# Altium schematic symbol library Capacitor - Aluminium TH.SchLib: 4591 symbols (part 10 of 27)
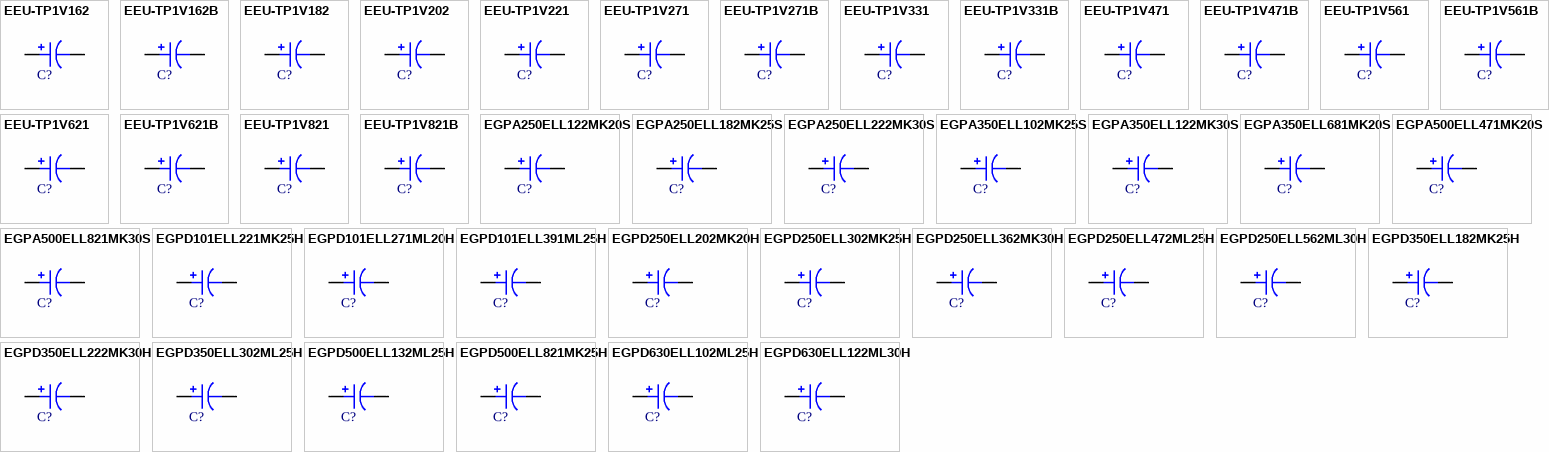
[diagram p123: symbols EEU-TP1V162 to EGPD630ELL122ML30H]

## EGPA350ELL122MK30S
designator C?, comment 1200uF  (value not drawn)
CAP ALUM 1200UF 20% 35V RADIAL; Part Number: EGPA350ELL122MK30S; Manufacturer: United Chemi-Con; TemperatureRange: -40C ~ 125C; Type: Polar; Ripple Current: 1.536A @ 120Hz; Value: 1200uF; PartId: 24370; Supplier 1: Digi-Key; Supplier Part Number 1: 565-3387-ND; ComponentLink1Description: Datasheet; ComponentLink1URL: //media.digikey.com/pdf/Data%20Sheets/United%20Chemi-Con%20PDFs/GPA_Series.PDF; ComponentLink2Description: Digi-Key Listing; ComponentLink2URL: https://www.digikey.com/product-detail/en/united-chemi-con/EGPA350ELL122MK30S/565-3387-ND/3528526; Tolerance: 20%; Voltage: 35V; Price: 1.59; Device Package: Radial, Can, 12.5mm
footprint CAP AL TH D12.5 L5 H35.5
pins: 1, 2

## EGPA350ELL681MK20S
designator C?, comment 680uF  (value not drawn)
CAP ALUM 680UF 20% 35V RADIAL; Part Number: EGPA350ELL681MK20S; Manufacturer: United Chemi-Con; TemperatureRange: -40C ~ 125C; Type: Polar; Ripple Current: 1.092A @ 120Hz; Value: 680uF; PartId: 23040; Supplier 1: Digi-Key; Supplier Part Number 1: 565-3388-ND; ComponentLink1Description: Datasheet; ComponentLink1URL: //media.digikey.com/pdf/Data%20Sheets/United%20Chemi-Con%20PDFs/GPA_Series.PDF; ComponentLink2Description: Digi-Key Listing; ComponentLink2URL: https://www.digikey.com/product-detail/en/united-chemi-con/EGPA350ELL681MK20S/565-3388-ND/3528541; Tolerance: 20%; Voltage: 35V; Price: 0; Device Package: Radial, Can, 12.5mm
footprint CAP AL TH D12.5 L5 H21.5
pins: 1, 2

## EGPA500ELL471MK20S
designator C?, comment 470uF  (value not drawn)
CAP ALUM 470UF 20% 50V RADIAL; Part Number: EGPA500ELL471MK20S; Manufacturer: United Chemi-Con; TemperatureRange: -40C ~ 125C; Type: Polar; Ripple Current: 750mA @ 120Hz; Value: 470uF; PartId: 23041; Supplier 1: Digi-Key; Supplier Part Number 1: 565-3397-ND; ComponentLink1Description: Datasheet; ComponentLink1URL: //media.digikey.com/pdf/Data%20Sheets/United%20Chemi-Con%20PDFs/GPA_Series.PDF; ComponentLink2Description: Digi-Key Listing; ComponentLink2URL: https://www.digikey.com/product-detail/en/united-chemi-con/EGPA500ELL471MK20S/565-3397-ND/3528552; Tolerance: 20%; Voltage: 50V; Price: 0; Device Package: Radial, Can, 12.5mm
footprint CAP AL TH D12.5 L5 H21.5
pins: 1, 2

## EGPA500ELL821MK30S
designator C?, comment 820uF  (value not drawn)
CAP ALUM 820UF 20% 50V RADIAL; Part Number: EGPA500ELL821MK30S; Manufacturer: United Chemi-Con; TemperatureRange: -40C ~ 125C; Type: Polar; Ripple Current: 1.29A @ 120Hz; Value: 820uF; PartId: 24342; Supplier 1: Digi-Key; Supplier Part Number 1: 565-3398-ND; ComponentLink1Description: Datasheet; ComponentLink1URL: //media.digikey.com/pdf/Data%20Sheets/United%20Chemi-Con%20PDFs/GPA_Series.PDF; ComponentLink2Description: Digi-Key Listing; ComponentLink2URL: https://www.digikey.com/product-detail/en/united-chemi-con/EGPA500ELL821MK30S/565-3398-ND/3528555; Tolerance: 20%; Voltage: 50V; Price: 1.33; Device Package: Radial, Can, 12.5mm
footprint CAP AL TH D12.5 L5 H35.5
pins: 1, 2

## EGPD101ELL221MK25H
designator C?, comment 220uF  (value not drawn)
CAP ALUM 220UF 20% 100V RADIAL; Part Number: EGPD101ELL221MK25H; Manufacturer: United Chemi-Con; TemperatureRange: -40C ~ 135C; Type: Polar; Ripple Current: 1.07A @ 120Hz; Value: 220uF; PartId: 23773; Supplier 1: Digi-Key; Supplier Part Number 1: 565-3824-ND; ComponentLink1Description: Datasheet; ComponentLink1URL: http://www.chemi-con.co.jp/cgi-bin/CAT_DB/SEARCH/cat_db_al.cgi?e=e&j=p&pdfname=gpd; ComponentLink2Description: Digi-Key Listing; ComponentLink2URL: https://www.digikey.com/product-detail/en/united-chemi-con/EGPD101ELL221MK25H/565-3824-ND/4843634; Tolerance: 20%; Voltage: 100V; Price: 2.01; Device Package: Radial, Can, 12.5mm
footprint CAP AL TH D12.5 L5 H26.5
pins: 1, 2

## EGPD101ELL271ML20H
designator C?, comment 270uF  (value not drawn)
CAP ALUM 270UF 20% 100V RADIAL; Part Number: EGPD101ELL271ML20H; Manufacturer: United Chemi-Con; TemperatureRange: -40C ~ 135C; Type: Polar; Ripple Current: 1.025A @ 120Hz; Value: 270uF; PartId: 26502; Supplier 1: Digi-Key; Supplier Part Number 1: 565-3825-ND; ComponentLink1Description: Datasheet; ComponentLink1URL: http://www.chemi-con.co.jp/cgi-bin/CAT_DB/SEARCH/cat_db_al.cgi?e=e&j=p&pdfname=gpd; ComponentLink2Description: Digi-Key Listing; ComponentLink2URL: https://www.digikey.com/product-detail/en/united-chemi-con/EGPD101ELL271ML20H/565-3825-ND/4843635; Tolerance: 20%; Voltage: 100V; Price: 2.47; Device Package: Radial, Can, 16mm
footprint CAP AL TH D16 L7.5 H22
pins: 1, 2

## EGPD101ELL391ML25H
designator C?, comment 390uF  (value not drawn)
CAP ALUM 390UF 20% 100V RADIAL; Part Number: EGPD101ELL391ML25H; Manufacturer: United Chemi-Con; TemperatureRange: -40C ~ 135C; Type: Polar; Ripple Current: 1.395A @ 120Hz; Value: 390uF; PartId: 26730; Supplier 1: Digi-Key; Supplier Part Number 1: 565-3827-ND; ComponentLink1Description: Datasheet; ComponentLink1URL: http://www.chemi-con.co.jp/cgi-bin/CAT_DB/SEARCH/cat_db_al.cgi?e=e&j=p&pdfname=gpd; ComponentLink2Description: Digi-Key Listing; ComponentLink2URL: https://www.digikey.com/product-detail/en/united-chemi-con/EGPD101ELL391ML25H/565-3827-ND/4843637; Tolerance: 20%; Voltage: 100V; Price: 3.13; Device Package: Radial, Can, 16mm
footprint CAP AL TH D16 L7.5 H26.5
pins: 1, 2

## EGPD250ELL202MK20H
designator C?, comment 2000uF  (value not drawn)
CAP ALUM 2000UF 20% 25V RADIAL; Part Number: EGPD250ELL202MK20H; Manufacturer: United Chemi-Con; TemperatureRange: -40C ~ 135C; Type: Polar; Ripple Current: 1.656A @ 120Hz; Value: 2000uF; PartId: 23070; Supplier 1: Digi-Key; Supplier Part Number 1: 565-3794-ND; ComponentLink1Description: Datasheet; ComponentLink1URL: http://www.chemi-con.co.jp/cgi-bin/CAT_DB/SEARCH/cat_db_al.cgi?e=e&j=p&pdfname=gpd; ComponentLink2Description: Digi-Key Listing; ComponentLink2URL: https://www.digikey.com/product-detail/en/united-chemi-con/EGPD250ELL202MK20H/565-3794-ND/4843604; Tolerance: 20%; Voltage: 25V; Price: 0; Device Package: Radial, Can, 12.5mm
footprint CAP AL TH D12.5 L5 H21.5
pins: 1, 2

## EGPD250ELL302MK25H
designator C?, comment 3000uF  (value not drawn)
CAP ALUM 3000UF 20% 25V RADIAL; Part Number: EGPD250ELL302MK25H; Manufacturer: United Chemi-Con; TemperatureRange: -40C ~ 135C; Type: Polar; Ripple Current: 2.61A @ 120Hz; Value: 3000uF; PartId: 24181; Supplier 1: Digi-Key; Supplier Part Number 1: 565-3795-ND; ComponentLink1Description: Datasheet; ComponentLink1URL: http://www.chemi-con.co.jp/cgi-bin/CAT_DB/SEARCH/cat_db_al.cgi?e=e&j=p&pdfname=gpd; ComponentLink2Description: Digi-Key Listing; ComponentLink2URL: https://www.digikey.com/product-detail/en/united-chemi-con/EGPD250ELL302MK25H/565-3795-ND/4843605; Tolerance: 20%; Voltage: 25V; Price: 1.92; Device Package: Radial, Can, 12.5mm
footprint CAP AL TH D12.5 L5 H27
pins: 1, 2

## EGPD250ELL362MK30H
designator C?, comment 3600uF  (value not drawn)
CAP ALUM 3600UF 20% 25V RADIAL; Part Number: EGPD250ELL362MK30H; Manufacturer: United Chemi-Con; TemperatureRange: -40C ~ 135C; Type: Polar; Ripple Current: 3.3675A @ 120Hz; Value: 3600uF; PartId: 24415; Supplier 1: Digi-Key; Supplier Part Number 1: 565-3796-ND; ComponentLink1Description: Datasheet; ComponentLink1URL: http://www.chemi-con.co.jp/cgi-bin/CAT_DB/SEARCH/cat_db_al.cgi?e=e&j=p&pdfname=gpd; ComponentLink2Description: Digi-Key Listing; ComponentLink2URL: https://www.digikey.com/product-detail/en/united-chemi-con/EGPD250ELL362MK30H/565-3796-ND/4843606; Tolerance: 20%; Voltage: 25V; Price: 2.14; Device Package: Radial, Can, 12.5mm
footprint CAP AL TH D12.5 L5 H35.5
pins: 1, 2

## EGPD250ELL472ML25H
designator C?, comment 4700uF  (value not drawn)
CAP ALUM 4700UF 20% 25V RADIAL; Part Number: EGPD250ELL472ML25H; Manufacturer: United Chemi-Con; TemperatureRange: -40C ~ 135C; Type: Polar; Ripple Current: 3.621A @ 120Hz; Value: 4700uF; PartId: 26722; Supplier 1: Digi-Key; Supplier Part Number 1: 565-3797-ND; ComponentLink1Description: Datasheet; ComponentLink1URL: http://www.chemi-con.co.jp/cgi-bin/CAT_DB/SEARCH/cat_db_al.cgi?e=e&j=p&pdfname=gpd; ComponentLink2Description: Digi-Key Listing; ComponentLink2URL: https://www.digikey.com/product-detail/en/united-chemi-con/EGPD250ELL472ML25H/565-3797-ND/4843607; Tolerance: 20%; Voltage: 25V; Price: 2.79; Device Package: Radial, Can, 16mm
footprint CAP AL TH D16 L7.5 H26.5
pins: 1, 2

## EGPD250ELL562ML30H
designator C?, comment 5600uF  (value not drawn)
CAP ALUM 5600UF 20% 25V RADIAL; Part Number: EGPD250ELL562ML30H; Manufacturer: United Chemi-Con; TemperatureRange: -40C ~ 135C; Type: Polar; Ripple Current: 2.89A @ 120Hz; Value: 5600uF; PartId: 27278; Supplier 1: Digi-Key; Supplier Part Number 1: 565-3798-ND; ComponentLink1Description: Datasheet; ComponentLink1URL: http://www.chemi-con.co.jp/cgi-bin/CAT_DB/SEARCH/cat_db_al.cgi?e=e&j=p&pdfname=gpd; ComponentLink2Description: Digi-Key Listing; ComponentLink2URL: https://www.digikey.com/product-detail/en/united-chemi-con/EGPD250ELL562ML30H/565-3798-ND/4843608; Tolerance: 20%; Voltage: 25V; Price: 3.15; Device Package: Radial, Can, 16mm
footprint CAP AL TH D16 L7.5 H33.5
pins: 1, 2

## EGPD350ELL182MK25H
designator C?, comment 1800uF  (value not drawn)
CAP ALUM 1800UF 20% 35V RADIAL; Part Number: EGPD350ELL182MK25H; Manufacturer: United Chemi-Con; TemperatureRange: -40C ~ 135C; Type: Polar; Ripple Current: 2.088A @ 120Hz; Value: 1800uF; PartId: 23772; Supplier 1: Digi-Key; Supplier Part Number 1: 565-3801-ND; ComponentLink1Description: Datasheet; ComponentLink1URL: http://www.chemi-con.co.jp/cgi-bin/CAT_DB/SEARCH/cat_db_al.cgi?e=e&j=p&pdfname=gpd; ComponentLink2Description: Digi-Key Listing; ComponentLink2URL: https://www.digikey.com/product-detail/en/united-chemi-con/EGPD350ELL182MK25H/565-3801-ND/4843611; Tolerance: 20%; Voltage: 35V; Price: 1.94; Device Package: Radial, Can, 12.5mm
footprint CAP AL TH D12.5 L5 H26.5
pins: 1, 2

## EGPD350ELL222MK30H
designator C?, comment 2200uF  (value not drawn)
CAP ALUM 2200UF 20% 35V RADIAL; Part Number: EGPD350ELL222MK30H; Manufacturer: United Chemi-Con; TemperatureRange: -40C ~ 135C; Type: Polar; Ripple Current: 3.3675A @ 120Hz; Value: 2200uF; PartId: 24417; Supplier 1: Digi-Key; Supplier Part Number 1: 565-3802-ND; ComponentLink1Description: Datasheet; ComponentLink1URL: http://www.chemi-con.co.jp/cgi-bin/CAT_DB/SEARCH/cat_db_al.cgi?e=e&j=p&pdfname=gpd; ComponentLink2Description: Digi-Key Listing; ComponentLink2URL: https://www.digikey.com/product-detail/en/united-chemi-con/EGPD350ELL222MK30H/565-3802-ND/4843612; Tolerance: 20%; Voltage: 35V; Price: 2.19; Device Package: Radial, Can, 12.5mm
footprint CAP AL TH D12.5 L5 H35.5
pins: 1, 2

## EGPD350ELL302ML25H
designator C?, comment 3000uF  (value not drawn)
CAP ALUM 3000UF 20% 35V RADIAL; Part Number: EGPD350ELL302ML25H; Manufacturer: United Chemi-Con; TemperatureRange: -40C ~ 135C; Type: Polar; Ripple Current: 3.195A @ 120Hz; Value: 3000uF; PartId: 26727; Supplier 1: Digi-Key; Supplier Part Number 1: 565-3804-ND; ComponentLink1Description: Datasheet; ComponentLink1URL: http://www.chemi-con.co.jp/cgi-bin/CAT_DB/SEARCH/cat_db_al.cgi?e=e&j=p&pdfname=gpd; ComponentLink2Description: Digi-Key Listing; ComponentLink2URL: https://www.digikey.com/product-detail/en/united-chemi-con/EGPD350ELL302ML25H/565-3804-ND/4843614; Tolerance: 20%; Voltage: 35V; Price: 2.92; Device Package: Radial, Can, 16mm
footprint CAP AL TH D16 L7.5 H26.5
pins: 1, 2

## EGPD500ELL132ML25H
designator C?, comment 1300uF  (value not drawn)
CAP ALUM 1300UF 20% 50V RADIAL; Part Number: EGPD500ELL132ML25H; Manufacturer: United Chemi-Con; TemperatureRange: -40C ~ 135C; Type: Polar; Ripple Current: 2.424A @ 120Hz; Value: 1300uF; PartId: 26716; Supplier 1: Digi-Key; Supplier Part Number 1: 565-3808-ND; ComponentLink1Description: Datasheet; ComponentLink1URL: http://www.chemi-con.co.jp/cgi-bin/CAT_DB/SEARCH/cat_db_al.cgi?e=e&j=p&pdfname=gpd; ComponentLink2Description: Digi-Key Listing; ComponentLink2URL: https://www.digikey.com/product-detail/en/united-chemi-con/EGPD500ELL132ML25H/565-3808-ND/4843618; Tolerance: 20%; Voltage: 50V; Price: 2.56; Device Package: Radial, Can, 16mm
footprint CAP AL TH D16 L7.5 H26.5
pins: 1, 2

## EGPD500ELL821MK25H
designator C?, comment 820uF  (value not drawn)
CAP ALUM 820UF 20% 50V RADIAL; Part Number: EGPD500ELL821MK25H; Manufacturer: United Chemi-Con; TemperatureRange: -40C ~ 135C; Type: Polar; Ripple Current: 2.01A @ 120Hz; Value: 820uF; PartId: 23764; Supplier 1: Digi-Key; Supplier Part Number 1: 565-3807-ND; ComponentLink1Description: Datasheet; ComponentLink1URL: http://www.chemi-con.co.jp/cgi-bin/CAT_DB/SEARCH/cat_db_al.cgi?e=e&j=p&pdfname=gpd; ComponentLink2Description: Digi-Key Listing; ComponentLink2URL: https://www.digikey.com/product-detail/en/united-chemi-con/EGPD500ELL821MK25H/565-3807-ND/4843617; Tolerance: 20%; Voltage: 50V; Price: 1.79; Device Package: Radial, Can, 12.5mm
footprint CAP AL TH D12.5 L5 H26.5
pins: 1, 2

## EGPD630ELL102ML25H
designator C?, comment 1000uF  (value not drawn)
CAP ALUM 1000UF 20% 63V RADIAL; Part Number: EGPD630ELL102ML25H; Manufacturer: United Chemi-Con; TemperatureRange: -40C ~ 135C; Type: Polar; Ripple Current: 1.764A @ 120Hz; Value: 1000uF; PartId: 26718; Supplier 1: Digi-Key; Supplier Part Number 1: 565-3814-ND; ComponentLink1Description: Datasheet; ComponentLink1URL: http://www.chemi-con.co.jp/cgi-bin/CAT_DB/SEARCH/cat_db_al.cgi?e=e&j=p&pdfname=gpd; ComponentLink2Description: Digi-Key Listing; ComponentLink2URL: https://www.digikey.com/product-detail/en/united-chemi-con/EGPD630ELL102ML25H/565-3814-ND/4843624; Tolerance: 20%; Voltage: 63V; Price: 2.61; Device Package: Radial, Can, 16mm
footprint CAP AL TH D16 L7.5 H26.5
pins: 1, 2

## EGPD630ELL122ML30H
designator C?, comment 1200uF  (value not drawn)
CAP ALUM 1200UF 20% 63V RADIAL; Part Number: EGPD630ELL122ML30H; Manufacturer: United Chemi-Con; TemperatureRange: -40C ~ 135C; Type: Polar; Ripple Current: 2.316A @ 120Hz; Value: 1200uF; PartId: 27264; Supplier 1: Digi-Key; Supplier Part Number 1: 565-3815-ND; ComponentLink1Description: Datasheet; ComponentLink1URL: http://www.chemi-con.co.jp/cgi-bin/CAT_DB/SEARCH/cat_db_al.cgi?e=e&j=p&pdfname=gpd; ComponentLink2Description: Digi-Key Listing; ComponentLink2URL: https://www.digikey.com/product-detail/en/united-chemi-con/EGPD630ELL122ML30H/565-3815-ND/4843625; Tolerance: 20%; Voltage: 63V; Price: 2.9; Device Package: Radial, Can, 16mm
footprint CAP AL TH D16 L7.5 H33.5
pins: 1, 2

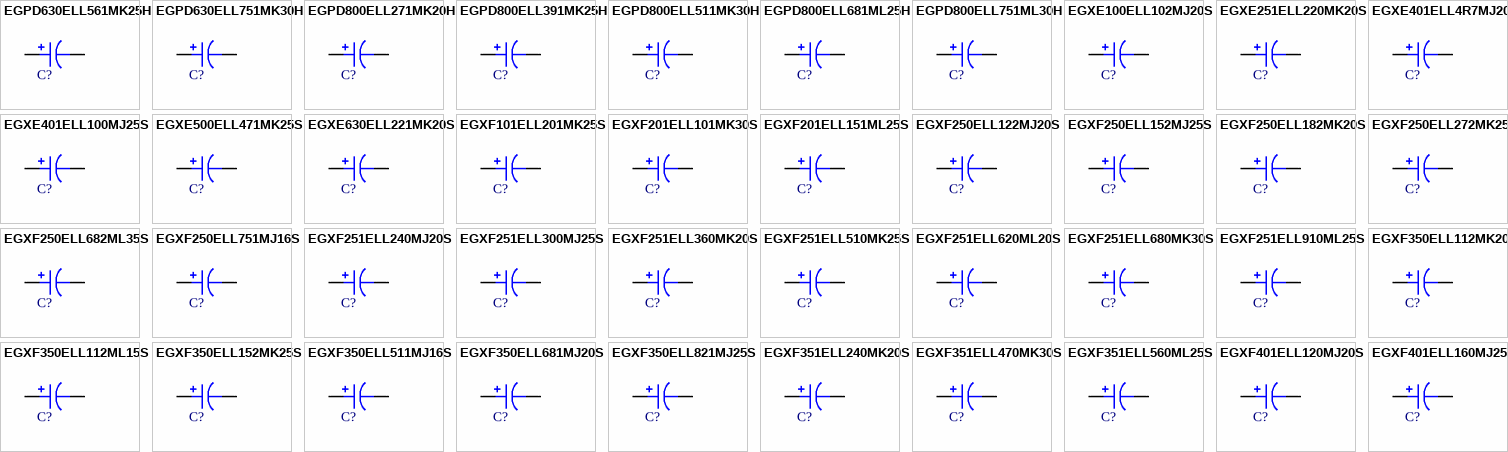
[diagram p39: symbols EGPD630ELL561MK25H to EGXF401ELL160MJ25S]

## EGPD630ELL561MK25H
designator C?, comment 560uF  (value not drawn)
CAP ALUM 560UF 20% 63V RADIAL; Part Number: EGPD630ELL561MK25H; Manufacturer: United Chemi-Con; TemperatureRange: -40C ~ 135C; Type: Polar; Ripple Current: 1.26A @ 120Hz; Value: 560uF; PartId: 23769; Supplier 1: Digi-Key; Supplier Part Number 1: 565-3811-ND; ComponentLink1Description: Datasheet; ComponentLink1URL: http://www.chemi-con.co.jp/cgi-bin/CAT_DB/SEARCH/cat_db_al.cgi?e=e&j=p&pdfname=gpd; ComponentLink2Description: Digi-Key Listing; ComponentLink2URL: https://www.digikey.com/product-detail/en/united-chemi-con/EGPD630ELL561MK25H/565-3811-ND/4843621; Tolerance: 20%; Voltage: 63V; Price: 1.88; Device Package: Radial, Can, 12.5mm
footprint CAP AL TH D12.5 L5 H26.5
pins: 1, 2

## EGPD630ELL751MK30H
designator C?, comment 750uF  (value not drawn)
CAP ALUM 750UF 20% 63V RADIAL; Part Number: EGPD630ELL751MK30H; Manufacturer: United Chemi-Con; TemperatureRange: -40C ~ 135C; Type: Polar; Ripple Current: 2.3325A @ 120Hz; Value: 750uF; PartId: 24407; Supplier 1: Digi-Key; Supplier Part Number 1: 565-3812-ND; ComponentLink1Description: Datasheet; ComponentLink1URL: http://www.chemi-con.co.jp/cgi-bin/CAT_DB/SEARCH/cat_db_al.cgi?e=e&j=p&pdfname=gpd; ComponentLink2Description: Digi-Key Listing; ComponentLink2URL: https://www.digikey.com/product-detail/en/united-chemi-con/EGPD630ELL751MK30H/565-3812-ND/4843622; Tolerance: 20%; Voltage: 63V; Price: 1.99; Device Package: Radial, Can, 12.5mm
footprint CAP AL TH D12.5 L5 H35.5
pins: 1, 2

## EGPD800ELL271MK20H
designator C?, comment 270uF  (value not drawn)
CAP ALUM 270UF 20% 80V RADIAL; Part Number: EGPD800ELL271MK20H; Manufacturer: United Chemi-Con; TemperatureRange: -40C ~ 135C; Type: Polar; Ripple Current: 820mA @ 120Hz; Value: 270uF; PartId: 23073; Supplier 1: Digi-Key; Supplier Part Number 1: 565-3817-ND; ComponentLink1Description: Datasheet; ComponentLink1URL: http://www.chemi-con.co.jp/cgi-bin/CAT_DB/SEARCH/cat_db_al.cgi?e=e&j=p&pdfname=gpd; ComponentLink2Description: Digi-Key Listing; ComponentLink2URL: https://www.digikey.com/product-detail/en/united-chemi-con/EGPD800ELL271MK20H/565-3817-ND/4843627; Tolerance: 20%; Voltage: 80V; Price: 0; Device Package: Radial, Can, 12.5mm
footprint CAP AL TH D12.5 L5 H21.5
pins: 1, 2

## EGPD800ELL391MK25H
designator C?, comment 390uF  (value not drawn)
CAP ALUM 390UF 20% 80V RADIAL; Part Number: EGPD800ELL391MK25H; Manufacturer: United Chemi-Con; TemperatureRange: -40C ~ 135C; Type: Polar; Ripple Current: 1.26A @ 120Hz; Value: 390uF; PartId: 23743; Supplier 1: Digi-Key; Supplier Part Number 1: 565-3818-ND; ComponentLink1Description: Datasheet; ComponentLink1URL: http://www.chemi-con.co.jp/cgi-bin/CAT_DB/SEARCH/cat_db_al.cgi?e=e&j=p&pdfname=gpd; ComponentLink2Description: Digi-Key Listing; ComponentLink2URL: https://www.digikey.com/product-detail/en/united-chemi-con/EGPD800ELL391MK25H/565-3818-ND/4843628; Tolerance: 20%; Voltage: 80V; Price: 1.62; Device Package: Radial, Can, 12.5mm
footprint CAP AL TH D12.5 L5 H26.5
pins: 1, 2

## EGPD800ELL511MK30H
designator C?, comment 510uF  (value not drawn)
CAP ALUM 510UF 20% 80V RADIAL; Part Number: EGPD800ELL511MK30H; Manufacturer: United Chemi-Con; TemperatureRange: -40C ~ 135C; Type: Polar; Ripple Current: 1.555A @ 120Hz; Value: 510uF; PartId: 24414; Supplier 1: Digi-Key; Supplier Part Number 1: 565-3819-ND; ComponentLink1Description: Datasheet; ComponentLink1URL: http://www.chemi-con.co.jp/cgi-bin/CAT_DB/SEARCH/cat_db_al.cgi?e=e&j=p&pdfname=gpd; ComponentLink2Description: Digi-Key Listing; ComponentLink2URL: https://www.digikey.com/product-detail/en/united-chemi-con/EGPD800ELL511MK30H/565-3819-ND/4843629; Tolerance: 20%; Voltage: 80V; Price: 2.1; Device Package: Radial, Can, 12.5mm
footprint CAP AL TH D12.5 L5 H35.5
pins: 1, 2

## EGPD800ELL681ML25H
designator C?, comment 680uF  (value not drawn)
CAP ALUM 680UF 20% 80V RADIAL; Part Number: EGPD800ELL681ML25H; Manufacturer: United Chemi-Con; TemperatureRange: -40C ~ 135C; Type: Polar; Ripple Current: 1.764A @ 120Hz; Value: 680uF; PartId: 26721; Supplier 1: Digi-Key; Supplier Part Number 1: 565-3820-ND; ComponentLink1Description: Datasheet; ComponentLink1URL: http://www.chemi-con.co.jp/cgi-bin/CAT_DB/SEARCH/cat_db_al.cgi?e=e&j=p&pdfname=gpd; ComponentLink2Description: Digi-Key Listing; ComponentLink2URL: https://www.digikey.com/product-detail/en/united-chemi-con/EGPD800ELL681ML25H/565-3820-ND/4843630; Tolerance: 20%; Voltage: 80V; Price: 2.76; Device Package: Radial, Can, 16mm
footprint CAP AL TH D16 L7.5 H26.5
pins: 1, 2

## EGPD800ELL751ML30H
designator C?, comment 750uF  (value not drawn)
CAP ALUM 750UF 20% 80V RADIAL; Part Number: EGPD800ELL751ML30H; Manufacturer: United Chemi-Con; TemperatureRange: -40C ~ 135C; Type: Polar; Ripple Current: 2.316A @ 120Hz; Value: 750uF; PartId: 27267; Supplier 1: Digi-Key; Supplier Part Number 1: 565-3821-ND; ComponentLink1Description: Datasheet; ComponentLink1URL: http://www.chemi-con.co.jp/cgi-bin/CAT_DB/SEARCH/cat_db_al.cgi?e=e&j=p&pdfname=gpd; ComponentLink2Description: Digi-Key Listing; ComponentLink2URL: https://www.digikey.com/product-detail/en/united-chemi-con/EGPD800ELL751ML30H/565-3821-ND/4843631; Tolerance: 20%; Voltage: 80V; Price: 2.98; Device Package: Radial, Can, 16mm
footprint CAP AL TH D16 L7.5 H33.5
pins: 1, 2

## EGXE100ELL102MJ20S
designator C?, comment 1000uF  (value not drawn)
CAP ALUM 1000UF 20% 10V RADIAL; Part Number: EGXE100ELL102MJ20S; Manufacturer: United Chemi-Con; TemperatureRange: -40C ~ 125C; Type: Polar; Ripple Current: 570mA @ 120Hz; Impedance: 75 mOhm; Value: 1000uF; PartId: 25871; Supplier 1: Digi-Key; Supplier Part Number 1: 565-3431-ND; ComponentLink1Description: Datasheet; ComponentLink1URL: http://www.chemi-con.co.jp/cgi-bin/CAT_DB/SEARCH/cat_db_al.cgi?e=e&j=p&pdfname=gxe; ComponentLink2Description: Digi-Key Listing; ComponentLink2URL: https://www.digikey.com/product-detail/en/united-chemi-con/EGXE100ELL102MJ20S/565-3431-ND/3528577; Tolerance: 20%; Voltage: 10V; Price: 0.63; Device Package: Radial, Can, 10mm
footprint CAP AL TH D10 L5 H22
pins: 1, 2

## EGXE251ELL220MK20S
designator C?, comment 22uF  (value not drawn)
CAP ALUM 22UF 20% 250V RADIAL; Part Number: EGXE251ELL220MK20S; Manufacturer: United Chemi-Con; TemperatureRange: -40C ~ 125C; Type: Polar; Ripple Current: 128mA @ 120Hz; Value: 22uF; PartId: 23446; Supplier 1: Digi-Key; Supplier Part Number 1: 565-3439-ND; ComponentLink1Description: Datasheet; ComponentLink1URL: http://www.chemi-con.co.jp/cgi-bin/CAT_DB/SEARCH/cat_db_al.cgi?e=e&j=p&pdfname=gxe; ComponentLink2Description: Digi-Key Listing; ComponentLink2URL: https://www.digikey.com/product-detail/en/united-chemi-con/EGXE251ELL220MK20S/565-3439-ND/3528605; Tolerance: 20%; Voltage: 250V; Price: 1.04; Device Package: Radial, Can, 12.5mm
footprint CAP AL TH D12.5 L5 H22
pins: 1, 2

## EGXE401ELL4R7MJ20S
designator C?, comment 4.7uF  (value not drawn)
CAP ALUM 4.7UF 20% 400V RADIAL; Part Number: EGXE401ELL4R7MJ20S; Manufacturer: United Chemi-Con; TemperatureRange: -25C ~ 125C; Type: Polar; Ripple Current: 53mA @ 120Hz; Value: 4.7uF; PartId: 25958; Supplier 1: Digi-Key; Supplier Part Number 1: 565-3441-ND; ComponentLink1Description: Datasheet; ComponentLink1URL: http://www.chemi-con.co.jp/cgi-bin/CAT_DB/SEARCH/cat_db_al.cgi?e=e&j=p&pdfname=gxe; ComponentLink2Description: Digi-Key Listing; ComponentLink2URL: https://www.digikey.com/product-detail/en/united-chemi-con/EGXE401ELL4R7MJ20S/565-3441-ND/3528623; Tolerance: 20%; Voltage: 400V; Price: 0.81; Device Package: Radial, Can, 10mm
footprint CAP AL TH D10 L5 H22
pins: 1, 2

## EGXE401ELL100MJ25S
designator C?, comment 10uF  (value not drawn)
CAP ALUM 10UF 20% 400V RADIAL; Part Number: EGXE401ELL100MJ25S; Manufacturer: United Chemi-Con; TemperatureRange: -25C ~ 125C; Type: Polar; Ripple Current: 86mA @ 120Hz; Value: 10uF; PartId: 26183; Supplier 1: Digi-Key; Supplier Part Number 1: 565-3440-ND; ComponentLink1Description: Datasheet; ComponentLink1URL: http://www.chemi-con.co.jp/cgi-bin/CAT_DB/SEARCH/cat_db_al.cgi?e=e&j=p&pdfname=gxe; ComponentLink2Description: Digi-Key Listing; ComponentLink2URL: https://www.digikey.com/product-detail/en/united-chemi-con/EGXE401ELL100MJ25S/565-3440-ND/3528620; Tolerance: 20%; Voltage: 400V; Price: 1.01; Device Package: Radial, Can, 10mm
footprint CAP AL TH D10 L5 H30
pins: 1, 2

## EGXE500ELL471MK25S
designator C?, comment 470uF  (value not drawn)
CAP ALUM 470UF 20% 50V RADIAL; Part Number: EGXE500ELL471MK25S; Manufacturer: United Chemi-Con; TemperatureRange: -40C ~ 125C; Type: Polar; Ripple Current: 575mA @ 120Hz; Impedance: 59 mOhm; Value: 470uF; PartId: 24001; Supplier 1: Digi-Key; Supplier Part Number 1: 565-3764-ND; ComponentLink1Description: Datasheet; ComponentLink1URL: http://www.chemi-con.co.jp/cgi-bin/CAT_DB/SEARCH/cat_db_al.cgi?e=e&j=p&pdfname=gxe; ComponentLink2Description: Digi-Key Listing; ComponentLink2URL: https://www.digikey.com/product-detail/en/united-chemi-con/EGXE500ELL471MK25S/565-3764-ND/3999885; Tolerance: 20%; Voltage: 50V; Price: 1.05; Device Package: Radial, Can, 12.5mm
footprint CAP AL TH D12.5 L5 H27
pins: 1, 2

## EGXE630ELL221MK20S
designator C?, comment 220uF  (value not drawn)
CAP ALUM 220UF 20% 63V RADIAL; Part Number: EGXE630ELL221MK20S; Manufacturer: United Chemi-Con; TemperatureRange: -40C ~ 125C; Type: Polar; Ripple Current: 525mA @ 120Hz; Impedance: 160 mOhm; Value: 220uF; PartId: 22971; Supplier 1: Digi-Key; Supplier Part Number 1: 565-4206-ND; ComponentLink1Description: Datasheet; ComponentLink1URL: http://www.chemi-con.co.jp/cgi-bin/CAT_DB/SEARCH/cat_db_al.cgi?e=e&j=p&pdfname=gxe; ComponentLink2Description: Digi-Key Listing; ComponentLink2URL: https://www.digikey.com/product-detail/en/united-chemi-con/EGXE630ELL221MK20S/565-4206-ND/3999891; Tolerance: 20%; Voltage: 63V; Price: 0; Device Package: Radial, Can, 12.5mm
footprint CAP AL TH D12.5 L5 H21.5
pins: 1, 2

## EGXF101ELL201MK25S
designator C?, comment 200uF  (value not drawn)
CAP MINI ALUM ELECTRO; Part Number: EGXF101ELL201MK25S; Manufacturer: United Chemi-Con; TemperatureRange: -40C ~ 125C; Tolerance: 20%; Voltage: 100V; Type: Polar; Ripple Current: 720mA @ 120Hz; Value: 200uF; PartId: 23774; Supplier 1: Digi-Key; Supplier Part Number 1: 565-4541-ND; ComponentLink1Description: Datasheet; ComponentLink1URL: http://www.chemi-con.co.jp/cgi-bin/CAT_DB/SEARCH/cat_db_al.cgi?e=e&j=p&pdfname=gxf; ComponentLink2Description: Digi-Key Listing; ComponentLink2URL: https://www.digikey.com/product-detail/en/united-chemi-con/EGXF101ELL201MK25S/565-4541-ND/6204522; Price: 2.09; Device Package: Radial, Can, 12.5mm
footprint CAP AL TH D12.5 L5 H26.5
pins: 1, 2

## EGXF201ELL101MK30S
designator C?, comment 100uF  (value not drawn)
CAP MINI ALUM ELECTRO; Part Number: EGXF201ELL101MK30S; Manufacturer: United Chemi-Con; TemperatureRange: -40C ~ 125C; Tolerance: 20%; Voltage: 200V; Type: Polar; Ripple Current: 619.5mA @ 120Hz; Value: 100uF; PartId: 24409; Supplier 1: Digi-Key; Supplier Part Number 1: 565-4547-ND; ComponentLink1Description: Datasheet; ComponentLink1URL: http://www.chemi-con.co.jp/cgi-bin/CAT_DB/SEARCH/cat_db_al.cgi?e=e&j=p&pdfname=gxf; ComponentLink2Description: Digi-Key Listing; ComponentLink2URL: https://www.digikey.com/product-detail/en/united-chemi-con/EGXF201ELL101MK30S/565-4547-ND/6204567; Price: 2; Device Package: Radial, Can, 12.5mm
footprint CAP AL TH D12.5 L5 H35.5
pins: 1, 2

## EGXF201ELL151ML25S
designator C?, comment 150uF  (value not drawn)
CAP MINI ALUM ELECTRO; Part Number: EGXF201ELL151ML25S; Manufacturer: United Chemi-Con; TemperatureRange: -40C ~ 125C; Tolerance: 20%; Voltage: 200V; Type: Polar; Ripple Current: 647.5mA @ 120Hz; Value: 150uF; PartId: 26720; Supplier 1: Digi-Key; Supplier Part Number 1: 565-4548-ND; ComponentLink1Description: Datasheet; ComponentLink1URL: http://www.chemi-con.co.jp/cgi-bin/CAT_DB/SEARCH/cat_db_al.cgi?e=e&j=p&pdfname=gxf; ComponentLink2Description: Digi-Key Listing; ComponentLink2URL: https://www.digikey.com/product-detail/en/united-chemi-con/EGXF201ELL151ML25S/565-4548-ND/6204574; Price: 2.74; Device Package: Radial, Can, 16mm
footprint CAP AL TH D16 L7.5 H26.5
pins: 1, 2

## EGXF250ELL122MJ20S
designator C?, comment 1200uF  (value not drawn)
CAP MINI ALUM ELECTRO; Part Number: EGXF250ELL122MJ20S; Manufacturer: United Chemi-Con; TemperatureRange: -40C ~ 125C; Tolerance: 20%; Voltage: 25V; Type: Polar; Ripple Current: 924mA @ 120Hz; Value: 1200uF; PartId: 25719; Supplier 1: Digi-Key; Supplier Part Number 1: 565-4552-ND; ComponentLink1Description: Datasheet; ComponentLink1URL: http://www.chemi-con.co.jp/cgi-bin/CAT_DB/SEARCH/cat_db_al.cgi?e=e&j=p&pdfname=gxf; ComponentLink2Description: Digi-Key Listing; ComponentLink2URL: https://www.digikey.com/product-detail/en/united-chemi-con/EGXF250ELL122MJ20S/565-4552-ND/6204396; Price: 1.46; Device Package: Radial, Can, 10mm
footprint CAP AL TH D10 L5 H22
pins: 1, 2

## EGXF250ELL152MJ25S
designator C?, comment 1500uF  (value not drawn)
CAP MINI ALUM ELECTRO; Part Number: EGXF250ELL152MJ25S; Manufacturer: United Chemi-Con; TemperatureRange: -40C ~ 125C; Tolerance: 20%; Voltage: 25V; Type: Polar; Ripple Current: 1.128A @ 120Hz; Value: 1500uF; PartId: 26193; Supplier 1: Digi-Key; Supplier Part Number 1: 565-4553-ND; ComponentLink1Description: Datasheet; ComponentLink1URL: http://www.chemi-con.co.jp/cgi-bin/CAT_DB/SEARCH/cat_db_al.cgi?e=e&j=p&pdfname=gxf; ComponentLink2Description: Digi-Key Listing; ComponentLink2URL: https://www.digikey.com/product-detail/en/united-chemi-con/EGXF250ELL152MJ25S/565-4553-ND/6204398; Price: 1.38; Device Package: Radial, Can, 10mm
footprint CAP AL TH D10 L5 H30
pins: 1, 2

## EGXF250ELL182MK20S
designator C?, comment 1800uF  (value not drawn)
CAP MINI ALUM ELECTRO; Part Number: EGXF250ELL182MK20S; Manufacturer: United Chemi-Con; TemperatureRange: -40C ~ 125C; Tolerance: 20%; Voltage: 25V; Type: Polar; Ripple Current: 954mA @ 120Hz; Value: 1800uF; PartId: 23062; Supplier 1: Digi-Key; Supplier Part Number 1: 565-4554-ND; ComponentLink1Description: Datasheet; ComponentLink1URL: http://www.chemi-con.co.jp/cgi-bin/CAT_DB/SEARCH/cat_db_al.cgi?e=e&j=p&pdfname=gxf; ComponentLink2Description: Digi-Key Listing; ComponentLink2URL: https://www.digikey.com/product-detail/en/united-chemi-con/EGXF250ELL182MK20S/565-4554-ND/6204400; Price: 0; Device Package: Radial, Can, 12.5mm
footprint CAP AL TH D12.5 L5 H21.5
pins: 1, 2

## EGXF250ELL272MK25S
designator C?, comment 2700uF  (value not drawn)